# Altium schematic symbol library IC_Maxim.SchLib: 843 symbols (part 17 of 20) (continued)
## MAX8685FETD+ (continued)
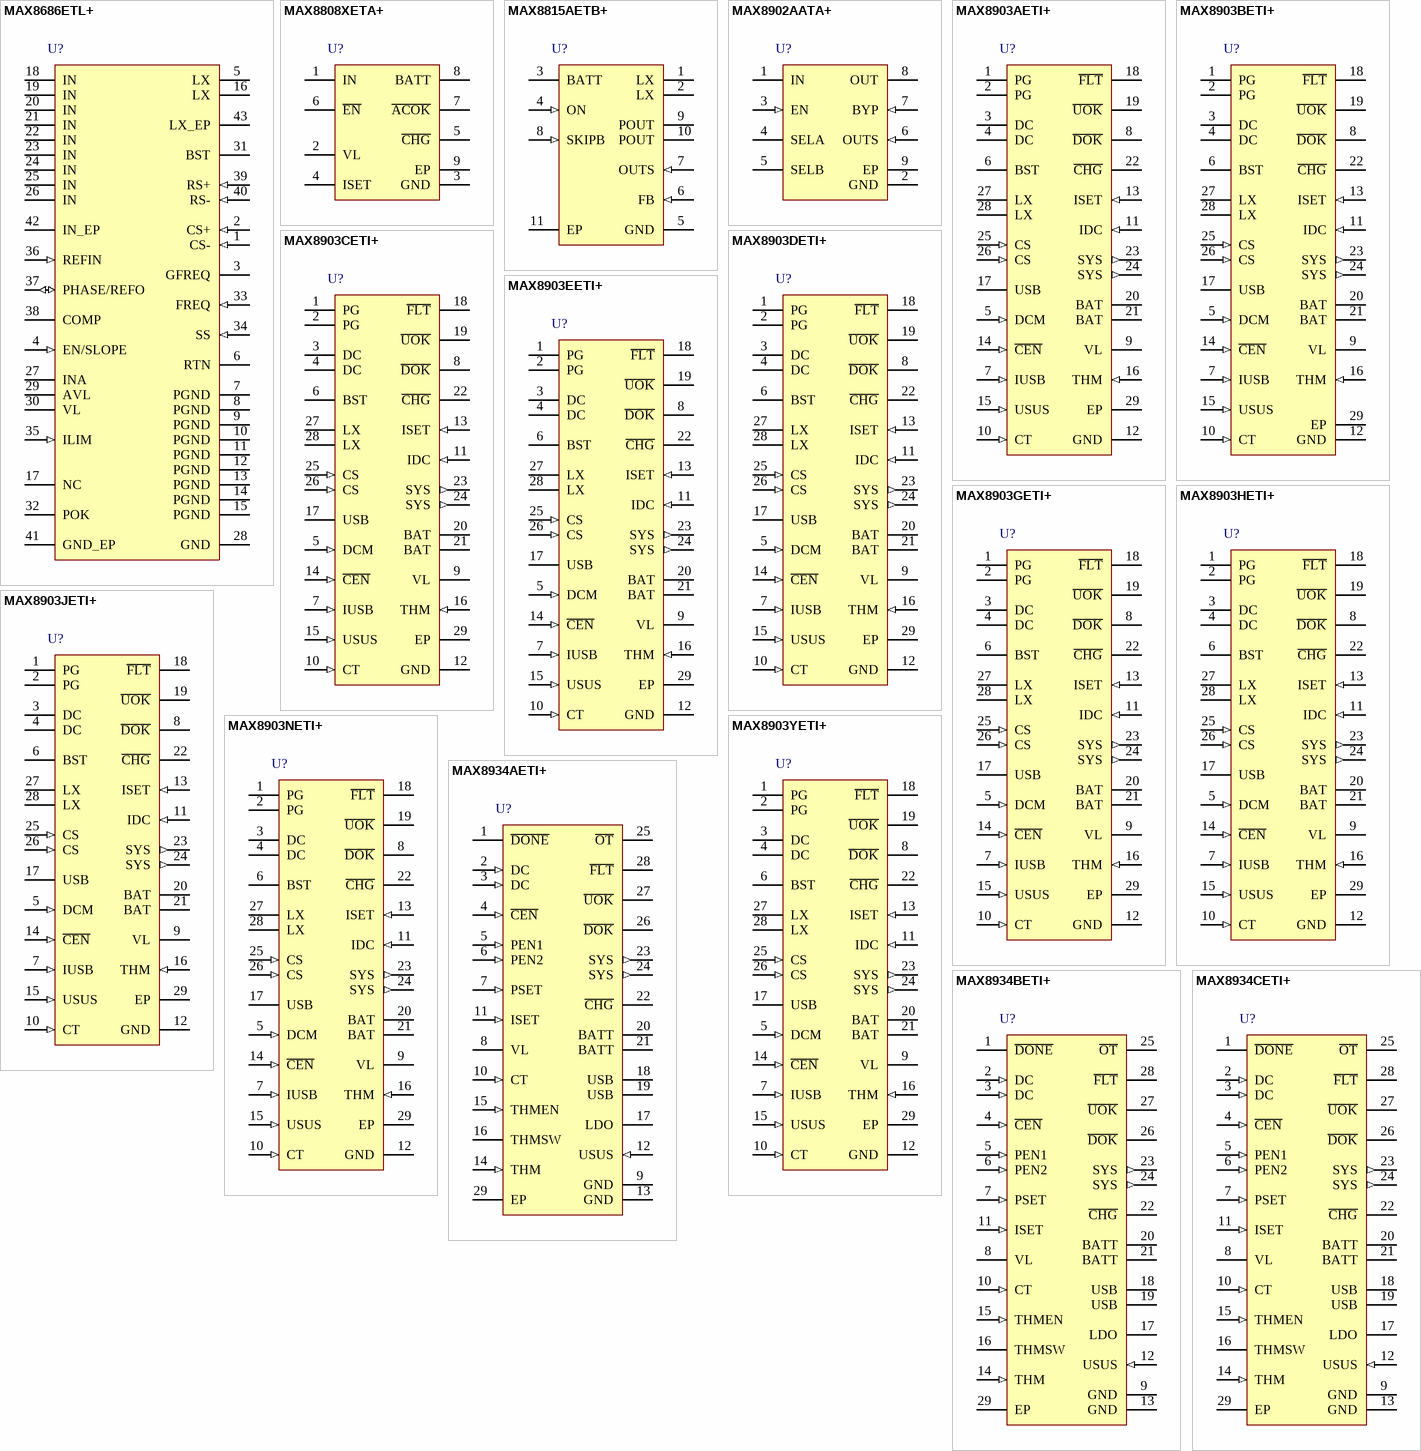
[diagram p19: symbols MAX8686ETL+ to MAX8934CETI+]

## MAX8686ETL+
designator U?
Single/Multiphase, Step-Down, DC-DC Converter with up to 25A Per Phase, 40-Pin TQFN, Pb-Free; DatasheetVersion: Rev 1, Oct-2010; PackageVersion: revE, 2011; PackageReference: T4066M+1; PackageDescription: 40-Pin Thin Quad Flat No-Lead, 6 x 6 x 0.75 mm Body, 0.5 mm Pitch, TQFN, Three Exposed Pads, Pb-Free; ComponentLink1Description: Manufacturer URL; ComponentLink1URL: http://www.maxim-ic.com; ComponentLink2Description: Datasheet; ComponentLink2URL: http://datasheets.maxim-ic.com/en/ds/MAX8686.pdf; ComponentLink3Description: Package Specification; ComponentLink3URL: http://pdfserv.maxim-ic.com/package_dwgs/21-0177.PDF
footprint QFN40_0.5-PAD(6X6)-A (Footprint not found)
pins: 1 CS- (in), 2 CS+ (in), 3 GFREQ, 4 EN/SLOPE (in), 5 LX, 6 RTN (power), 7 PGND (power), 8 PGND (power), 9 PGND (power), 10 PGND (power), 11 PGND (power), 12 PGND (power), 13 PGND (power), 14 PGND (power), 15 PGND (power), 16 LX, 17 NC, 18 IN (power), 19 IN (power), 20 IN (power), 21 IN (power), 22 IN (power), 23 IN (power), 24 IN (power), 25 IN (power), 26 IN (power), 27 INA (power), 28 GND (power), 29 AVL (power), 30 VL (power), 31 BST, 32 POK (oc), 33 FREQ (in), 34 SS (in), 35 ILIM (in), 36 REFIN (in), 37 PHASE/REFO (io), 38 COMP, 39 RS+ (in), 40 RS- (in), 41 GND_EP (power), 42 IN_EP, 43 LX_EP

## MAX8808XETA+
designator U?
1A Linear Li+ Battery Charger with Integrated Pass FET and Thermal Regulation, 8-Pin TDFN, -40癈 to +85癈, Pb-Free; DatasheetVersion: Rev 0, Apr-2005; PackageVersion: revF, 2011; PackageReference: T822+1; PackageDescription: 8-Pin Plastic Very Very Thin Dual Flatpack, No Leads, 2 x 2 x 0.75 mm Body, 0.5 mm Pitch, TDFN, Pb-Free; Code_JEDEC: MO-229*; ComponentLink1Description: Manufacturer URL; ComponentLink1URL: http://www.maxim-ic.com; ComponentLink2Description: Datasheet; ComponentLink2URL: http://datasheets.maxim-ic.com/en/ds/MAX8808X-MAX8808Z.pdf; ComponentLink3Description: Package Specification; ComponentLink3URL: http://pdfserv.maxim-ic.com/package_dwgs/21-0168.PDF
footprint DFN8_0.5-PAD(2X2) (Footprint not found)
pins: 1 IN (power), 2 VL (power), 3 GND (power), 4 ISET, 5 ~{CHG} (oc), 6 ~{EN}, 7 ~{ACOK} (oc), 8 BATT (power), 9 EP (power)

## MAX8815AETB+
designator U?
1A, 97% Efficiency, 30uA Quiescent Current, Step-Up Converter with True Shutdown(TM), 10-Pin TDFN-EP, -40癈 to +85癈, Pb-Free; DatasheetVersion: Rev 1, Aug-2008; PackageVersion: revJ, 2009; PackageReference: T1033+2; PackageDescription: 10-Pin Plastic Very Very Thin Dual Flatpack No Leads, Exposed Pad, 3 x 3 x 0.8 mm Body, TDFN-EP, Pb-Free; Code_JEDEC: MO-229-WEED-3; ComponentLink1Description: Manufacturer URL; ComponentLink1URL: http://www.maxim-ic.com; ComponentLink2Description: Datasheet; ComponentLink2URL: http://datasheets.maxim-ic.com/en/ds/MAX8815A.pdf; ComponentLink3Description: Package Specification; ComponentLink3URL: http://pdfserv.maxim-ic.com/package_dwgs/21-0137.PDF
footprint DFN10_0.5-PAD(3X3) (Footprint not found)
pins: 1 LX, 2 LX, 3 BATT (power), 4 ON (in), 5 GND (power), 6 FB (in), 7 OUTS (in), 8 SKIPB (in), 9 POUT (power), 10 POUT (power), 11 EP (power)

## MAX8902AATA+
designator U?
Low-Noise, Low-Dropout, High-PSRR, 500mA Linear Regulator, 8-Pin TDFN-EP, -40癈 to +125癈, Pb-Free; DatasheetVersion: Rev 4, Apr-2011; PackageVersion: revF, 2011; PackageReference: T822+1; PackageDescription: 8-Pin Plastic Very Very Thin Dual Flatpack, No Leads, 2 x 2 x 0.75 mm Body, 0.5 mm Pitch, TDFN, Pb-Free; Code_JEDEC: MO-229*; ComponentLink1Description: Manufacturer URL; ComponentLink1URL: http://www.maxim-ic.com; ComponentLink2Description: Datasheet; ComponentLink2URL: http://datasheets.maxim-ic.com/en/ds/MAX8902-MAX8902B.pdf; ComponentLink3Description: Package Specification; ComponentLink3URL: http://pdfserv.maxim-ic.com/package_dwgs/21-0168.PDF
footprint DFN8_0.5-PAD(2X2) (Footprint not found)
pins: 1 IN (power), 2 GND (power), 3 EN (in), 4 SELA, 5 SELB, 6 OUTS (in), 7 BYP (in), 8 OUT (power), 9 EP (power)

## MAX8903AETI+
designator U?
2A 1-Cell Li+ DC-DC Charger for USB and Adapter Power, 28-Pin TQFN, -40癈 to +85癈, Pb-Free; DatasheetVersion: Rev 5, Sep-2011; PackageVersion: revK, 2011; PackageReference: T2844+1; PackageDescription: 28-Pin Thin Quad Flatpack, No Leads, 4 x 4 x 0.75mm Body, 0.4 mm Pitch, TQFN, Pb-Free; ComponentLink1Description: Manufacturer URL; ComponentLink1URL: http://www.maxim-ic.com; ComponentLink2Description: Datasheet; ComponentLink2URL: http://datasheets.maxim-ic.com/en/ds/MAX8903A-MAX8903Y.pdf; ComponentLink3Description: Package Specification; ComponentLink3URL: http://pdfserv.maxim-ic.com/package_dwgs/21-0139.PDF
footprint QFN28_0.4-PAD(4X4) (Footprint not found)
pins: 1 PG (power), 2 PG (power), 3 DC (power), 4 DC (power), 5 DCM (in), 6 BST, 7 IUSB (in), 8 ~{DOK} (oc), 9 VL (power), 10 CT (in), 11 IDC (in), 12 GND (power), 13 ISET (in), 14 ~{CEN} (in), 15 USUS (in), 16 THM (in), 17 USB (power), 18 ~{FLT} (oc), 19 ~{UOK} (oc), 20 BAT (power), 21 BAT (power), 22 ~{CHG} (oc), 23 SYS (out), 24 SYS (out), 25 CS (in), 26 CS (in), 27 LX, 28 LX, 29 EP (power)

## MAX8903BETI+
designator U?
2A 1-Cell Li+ DC-DC Charger for USB and Adapter Power, 28-Pin TQFN, -40癈 to +85癈, Pb-Free; DatasheetVersion: Rev 5, Sep-2011; PackageVersion: revK, 2011; PackageReference: T2844+1; PackageDescription: 28-Pin Thin Quad Flatpack, No Leads, 4 x 4 x 0.75mm Body, 0.4 mm Pitch, TQFN, Pb-Free; ComponentLink1Description: Manufacturer URL; ComponentLink1URL: http://www.maxim-ic.com; ComponentLink2Description: Datasheet; ComponentLink2URL: http://datasheets.maxim-ic.com/en/ds/MAX8903A-MAX8903Y.pdf; ComponentLink3Description: Package Specification; ComponentLink3URL: http://pdfserv.maxim-ic.com/package_dwgs/21-0139.PDF
footprint QFN28_0.4-PAD(4X4) (Footprint not found)
pins: 1 PG (power), 2 PG (power), 3 DC (power), 4 DC (power), 5 DCM (in), 6 BST, 7 IUSB (in), 8 ~{DOK} (oc), 9 VL (power), 10 CT (in), 11 IDC (in), 12 GND (power), 13 ISET (in), 14 ~{CEN} (in), 15 USUS (in), 16 THM (in), 17 USB (power), 18 ~{FLT} (oc), 19 ~{UOK} (oc), 20 BAT (power), 21 BAT (power), 22 ~{CHG} (oc), 23 SYS (out), 24 SYS (out), 25 CS (in), 26 CS (in), 27 LX, 28 LX, 29 EP (power)

## MAX8903CETI+
designator U?
2A 1-Cell Li+ DC-DC Charger for USB and Adapter Power, 28-Pin TQFN, -40癈 to +85癈, Pb-Free; DatasheetVersion: Rev 5, Sep-2011; PackageVersion: revK, 2011; PackageReference: T2844+1; PackageDescription: 28-Pin Thin Quad Flatpack, No Leads, 4 x 4 x 0.75mm Body, 0.4 mm Pitch, TQFN, Pb-Free; ComponentLink1Description: Manufacturer URL; ComponentLink1URL: http://www.maxim-ic.com; ComponentLink2Description: Datasheet; ComponentLink2URL: http://datasheets.maxim-ic.com/en/ds/MAX8903A-MAX8903Y.pdf; ComponentLink3Description: Package Specification; ComponentLink3URL: http://pdfserv.maxim-ic.com/package_dwgs/21-0139.PDF
footprint QFN28_0.4-PAD(4X4) (Footprint not found)
pins: 1 PG (power), 2 PG (power), 3 DC (power), 4 DC (power), 5 DCM (in), 6 BST, 7 IUSB (in), 8 ~{DOK} (oc), 9 VL (power), 10 CT (in), 11 IDC (in), 12 GND (power), 13 ISET (in), 14 ~{CEN} (in), 15 USUS (in), 16 THM (in), 17 USB (power), 18 ~{FLT} (oc), 19 ~{UOK} (oc), 20 BAT (power), 21 BAT (power), 22 ~{CHG} (oc), 23 SYS (out), 24 SYS (out), 25 CS (in), 26 CS (in), 27 LX, 28 LX, 29 EP (power)

## MAX8903DETI+
designator U?
2A 1-Cell Li+ DC-DC Charger for USB and Adapter Power, 28-Pin TQFN, -40癈 to +85癈, Pb-Free; DatasheetVersion: Rev 5, Sep-2011; PackageVersion: revK, 2011; PackageReference: T2844+1; PackageDescription: 28-Pin Thin Quad Flatpack, No Leads, 4 x 4 x 0.75mm Body, 0.4 mm Pitch, TQFN, Pb-Free; ComponentLink1Description: Manufacturer URL; ComponentLink1URL: http://www.maxim-ic.com; ComponentLink2Description: Datasheet; ComponentLink2URL: http://datasheets.maxim-ic.com/en/ds/MAX8903A-MAX8903Y.pdf; ComponentLink3Description: Package Specification; ComponentLink3URL: http://pdfserv.maxim-ic.com/package_dwgs/21-0139.PDF
footprint QFN28_0.4-PAD(4X4) (Footprint not found)
pins: 1 PG (power), 2 PG (power), 3 DC (power), 4 DC (power), 5 DCM (in), 6 BST, 7 IUSB (in), 8 ~{DOK} (oc), 9 VL (power), 10 CT (in), 11 IDC (in), 12 GND (power), 13 ISET (in), 14 ~{CEN} (in), 15 USUS (in), 16 THM (in), 17 USB (power), 18 ~{FLT} (oc), 19 ~{UOK} (oc), 20 BAT (power), 21 BAT (power), 22 ~{CHG} (oc), 23 SYS (out), 24 SYS (out), 25 CS (in), 26 CS (in), 27 LX, 28 LX, 29 EP (power)

## MAX8903EETI+
designator U?
2A 1-Cell Li+ DC-DC Charger for USB and Adapter Power, 28-Pin TQFN, -40癈 to +85癈, Pb-Free; DatasheetVersion: Rev 5, Sep-2011; PackageVersion: revK, 2011; PackageReference: T2844+1; PackageDescription: 28-Pin Thin Quad Flatpack, No Leads, 4 x 4 x 0.75mm Body, 0.4 mm Pitch, TQFN, Pb-Free; ComponentLink1Description: Manufacturer URL; ComponentLink1URL: http://www.maxim-ic.com; ComponentLink2Description: Datasheet; ComponentLink2URL: http://datasheets.maxim-ic.com/en/ds/MAX8903A-MAX8903Y.pdf; ComponentLink3Description: Package Specification; ComponentLink3URL: http://pdfserv.maxim-ic.com/package_dwgs/21-0139.PDF
footprint QFN28_0.4-PAD(4X4) (Footprint not found)
pins: 1 PG (power), 2 PG (power), 3 DC (power), 4 DC (power), 5 DCM (in), 6 BST, 7 IUSB (in), 8 ~{DOK} (oc), 9 VL (power), 10 CT (in), 11 IDC (in), 12 GND (power), 13 ISET (in), 14 ~{CEN} (in), 15 USUS (in), 16 THM (in), 17 USB (power), 18 ~{FLT} (oc), 19 ~{UOK} (oc), 20 BAT (power), 21 BAT (power), 22 ~{CHG} (oc), 23 SYS (out), 24 SYS (out), 25 CS (in), 26 CS (in), 27 LX, 28 LX, 29 EP (power)

## MAX8903GETI+
designator U?
2A 1-Cell Li+ DC-DC Charger for USB and Adapter Power, 28-Pin TQFN, -40癈 to +85癈, Pb-Free; DatasheetVersion: Rev 5, Sep-2011; PackageVersion: revK, 2011; PackageReference: T2844+1; PackageDescription: 28-Pin Thin Quad Flatpack, No Leads, 4 x 4 x 0.75mm Body, 0.4 mm Pitch, TQFN, Pb-Free; ComponentLink1Description: Manufacturer URL; ComponentLink1URL: http://www.maxim-ic.com; ComponentLink2Description: Datasheet; ComponentLink2URL: http://datasheets.maxim-ic.com/en/ds/MAX8903A-MAX8903Y.pdf; ComponentLink3Description: Package Specification; ComponentLink3URL: http://pdfserv.maxim-ic.com/package_dwgs/21-0139.PDF
footprint QFN28_0.4-PAD(4X4) (Footprint not found)
pins: 1 PG (power), 2 PG (power), 3 DC (power), 4 DC (power), 5 DCM (in), 6 BST, 7 IUSB (in), 8 ~{DOK} (oc), 9 VL (power), 10 CT (in), 11 IDC (in), 12 GND (power), 13 ISET (in), 14 ~{CEN} (in), 15 USUS (in), 16 THM (in), 17 USB (power), 18 ~{FLT} (oc), 19 ~{UOK} (oc), 20 BAT (power), 21 BAT (power), 22 ~{CHG} (oc), 23 SYS (out), 24 SYS (out), 25 CS (in), 26 CS (in), 27 LX, 28 LX, 29 EP (power)

## MAX8903HETI+
designator U?
2A 1-Cell Li+ DC-DC Charger for USB and Adapter Power, 28-Pin TQFN, -40癈 to +85癈, Pb-Free; DatasheetVersion: Rev 5, Sep-2011; PackageVersion: revK, 2011; PackageReference: T2844+1; PackageDescription: 28-Pin Thin Quad Flatpack, No Leads, 4 x 4 x 0.75mm Body, 0.4 mm Pitch, TQFN, Pb-Free; ComponentLink1Description: Manufacturer URL; ComponentLink1URL: http://www.maxim-ic.com; ComponentLink2Description: Datasheet; ComponentLink2URL: http://datasheets.maxim-ic.com/en/ds/MAX8903A-MAX8903Y.pdf; ComponentLink3Description: Package Specification; ComponentLink3URL: http://pdfserv.maxim-ic.com/package_dwgs/21-0139.PDF
footprint QFN28_0.4-PAD(4X4) (Footprint not found)
pins: 1 PG (power), 2 PG (power), 3 DC (power), 4 DC (power), 5 DCM (in), 6 BST, 7 IUSB (in), 8 ~{DOK} (oc), 9 VL (power), 10 CT (in), 11 IDC (in), 12 GND (power), 13 ISET (in), 14 ~{CEN} (in), 15 USUS (in), 16 THM (in), 17 USB (power), 18 ~{FLT} (oc), 19 ~{UOK} (oc), 20 BAT (power), 21 BAT (power), 22 ~{CHG} (oc), 23 SYS (out), 24 SYS (out), 25 CS (in), 26 CS (in), 27 LX, 28 LX, 29 EP (power)

## MAX8903JETI+
designator U?
2A 1-Cell Li+ DC-DC Charger for USB and Adapter Power, 28-Pin TQFN, -40癈 to +85癈, Pb-Free; DatasheetVersion: Rev 5, Sep-2011; PackageVersion: revK, 2011; PackageReference: T2844+1; PackageDescription: 28-Pin Thin Quad Flatpack, No Leads, 4 x 4 x 0.75mm Body, 0.4 mm Pitch, TQFN, Pb-Free; ComponentLink1Description: Manufacturer URL; ComponentLink1URL: http://www.maxim-ic.com; ComponentLink2Description: Datasheet; ComponentLink2URL: http://datasheets.maxim-ic.com/en/ds/MAX8903A-MAX8903Y.pdf; ComponentLink3Description: Package Specification; ComponentLink3URL: http://pdfserv.maxim-ic.com/package_dwgs/21-0139.PDF
footprint QFN28_0.4-PAD(4X4) (Footprint not found)
pins: 1 PG (power), 2 PG (power), 3 DC (power), 4 DC (power), 5 DCM (in), 6 BST, 7 IUSB (in), 8 ~{DOK} (oc), 9 VL (power), 10 CT (in), 11 IDC (in), 12 GND (power), 13 ISET (in), 14 ~{CEN} (in), 15 USUS (in), 16 THM (in), 17 USB (power), 18 ~{FLT} (oc), 19 ~{UOK} (oc), 20 BAT (power), 21 BAT (power), 22 ~{CHG} (oc), 23 SYS (out), 24 SYS (out), 25 CS (in), 26 CS (in), 27 LX, 28 LX, 29 EP (power)

## MAX8903NETI+
designator U?
2A 1-Cell Li+ DC-DC Charger for USB and Adapter Power, 28-Pin TQFN, -40癈 to +85癈, Pb-Free; DatasheetVersion: Rev 5, Sep-2011; PackageVersion: revK, 2011; PackageReference: T2844+1; PackageDescription: 28-Pin Thin Quad Flatpack, No Leads, 4 x 4 x 0.75mm Body, 0.4 mm Pitch, TQFN, Pb-Free; ComponentLink1Description: Manufacturer URL; ComponentLink1URL: http://www.maxim-ic.com; ComponentLink2Description: Datasheet; ComponentLink2URL: http://datasheets.maxim-ic.com/en/ds/MAX8903A-MAX8903Y.pdf; ComponentLink3Description: Package Specification; ComponentLink3URL: http://pdfserv.maxim-ic.com/package_dwgs/21-0139.PDF
footprint QFN28_0.4-PAD(4X4) (Footprint not found)
pins: 1 PG (power), 2 PG (power), 3 DC (power), 4 DC (power), 5 DCM (in), 6 BST, 7 IUSB (in), 8 ~{DOK} (oc), 9 VL (power), 10 CT (in), 11 IDC (in), 12 GND (power), 13 ISET (in), 14 ~{CEN} (in), 15 USUS (in), 16 THM (in), 17 USB (power), 18 ~{FLT} (oc), 19 ~{UOK} (oc), 20 BAT (power), 21 BAT (power), 22 ~{CHG} (oc), 23 SYS (out), 24 SYS (out), 25 CS (in), 26 CS (in), 27 LX, 28 LX, 29 EP (power)

## MAX8903YETI+
designator U?
2A 1-Cell Li+ DC-DC Charger for USB and Adapter Power, 28-Pin TQFN, -40癈 to +85癈, Pb-Free; DatasheetVersion: Rev 5, Sep-2011; PackageVersion: revK, 2011; PackageReference: T2844+1; PackageDescription: 28-Pin Thin Quad Flatpack, No Leads, 4 x 4 x 0.75mm Body, 0.4 mm Pitch, TQFN, Pb-Free; ComponentLink1Description: Manufacturer URL; ComponentLink1URL: http://www.maxim-ic.com; ComponentLink2Description: Datasheet; ComponentLink2URL: http://datasheets.maxim-ic.com/en/ds/MAX8903A-MAX8903Y.pdf; ComponentLink3Description: Package Specification; ComponentLink3URL: http://pdfserv.maxim-ic.com/package_dwgs/21-0139.PDF
footprint QFN28_0.4-PAD(4X4) (Footprint not found)
pins: 1 PG (power), 2 PG (power), 3 DC (power), 4 DC (power), 5 DCM (in), 6 BST, 7 IUSB (in), 8 ~{DOK} (oc), 9 VL (power), 10 CT (in), 11 IDC (in), 12 GND (power), 13 ISET (in), 14 ~{CEN} (in), 15 USUS (in), 16 THM (in), 17 USB (power), 18 ~{FLT} (oc), 19 ~{UOK} (oc), 20 BAT (power), 21 BAT (power), 22 ~{CHG} (oc), 23 SYS (out), 24 SYS (out), 25 CS (in), 26 CS (in), 27 LX, 28 LX, 29 EP (power)

## MAX8934AETI+
designator U?
Dual-Input Linear Charger, Smart Power Selector with Advanced Battery Temperature Monitoring, 5.4V sys voltage, 3964 Thermistor beta+, 28-Pin TQFN, -40癈 to +85癈, Pb-Free; DatasheetVersion: Rev 2, Jun-2010; PackageVersion: revK, 2011; PackageReference: T2844+1; PackageDescription: 28-Pin Thin Quad Flatpack, No Leads, 4 x 4 x 0.75mm Body, 0.4 mm Pitch, TQFN, Pb-Free; ComponentLink1Description: Manufacturer URL; ComponentLink1URL: http://www.maxim-ic.com; ComponentLink2Description: Datasheet; ComponentLink2URL: http://datasheets.maxim-ic.com/en/ds/MAX8934A-MAX8934E.pdf; ComponentLink3Description: Package Specification; ComponentLink3URL: http://pdfserv.maxim-ic.com/package_dwgs/21-0139.PDF
footprint QFN28_0.4-PAD(4X4) (Footprint not found)
pins: 1 ~{DONE} (oc), 2 DC (in), 3 DC (in), 4 ~{CEN} (in), 5 PEN1 (in), 6 PEN2 (in), 7 PSET (in), 8 VL (power), 9 GND (power), 10 CT (in), 11 ISET (in), 12 USUS (in), 13 GND (power), 14 THM (in), 15 THMEN (in), 16 THMSW, 17 LDO (power), 18 USB (power), 19 USB (power), 20 BATT (power), 21 BATT (power), 22 ~{CHG} (oc), 23 SYS (out), 24 SYS (out), 25 ~{OT} (oc), 26 ~{DOK} (oc), 27 ~{UOK} (oc), 28 ~{FLT} (oc), 29 EP (power)

## MAX8934BETI+
designator U?
Dual-Input Linear Charger, Smart Power Selector with Advanced Battery Temperature Monitoring, 4.35V sys voltage, 3477 Thermistor beta+, 28-Pin TQFN, -40癈 to +85癈, Pb-Free; DatasheetVersion: Rev 2, Jun-2010; PackageVersion: revK, 2011; PackageReference: T2844+1; PackageDescription: 28-Pin Thin Quad Flatpack, No Leads, 4 x 4 x 0.75mm Body, 0.4 mm Pitch, TQFN, Pb-Free; ComponentLink1Description: Manufacturer URL; ComponentLink1URL: http://www.maxim-ic.com; ComponentLink2Description: Datasheet; ComponentLink2URL: http://datasheets.maxim-ic.com/en/ds/MAX8934A-MAX8934E.pdf; ComponentLink3Description: Package Specification; ComponentLink3URL: http://pdfserv.maxim-ic.com/package_dwgs/21-0139.PDF
footprint QFN28_0.4-PAD(4X4) (Footprint not found)
pins: 1 ~{DONE} (oc), 2 DC (in), 3 DC (in), 4 ~{CEN} (in), 5 PEN1 (in), 6 PEN2 (in), 7 PSET (in), 8 VL (power), 9 GND (power), 10 CT (in), 11 ISET (in), 12 USUS (in), 13 GND (power), 14 THM (in), 15 THMEN (in), 16 THMSW, 17 LDO (power), 18 USB (power), 19 USB (power), 20 BATT (power), 21 BATT (power), 22 ~{CHG} (oc), 23 SYS (out), 24 SYS (out), 25 ~{OT} (oc), 26 ~{DOK} (oc), 27 ~{UOK} (oc), 28 ~{FLT} (oc), 29 EP (power)

## MAX8934CETI+
designator U?
Dual-Input Linear Charger, Smart Power Selector with Advanced Battery Temperature Monitoring, 4.35V sys voltage, 3964 Thermistor beta+, 28-Pin TQFN, -40癈 to +85癈, Pb-Free; DatasheetVersion: Rev 2, Jun-2010; PackageVersion: revK, 2011; PackageReference: T2844+1; PackageDescription: 28-Pin Thin Quad Flatpack, No Leads, 4 x 4 x 0.75mm Body, 0.4 mm Pitch, TQFN, Pb-Free; ComponentLink1Description: Manufacturer URL; ComponentLink1URL: http://www.maxim-ic.com; ComponentLink2Description: Datasheet; ComponentLink2URL: http://datasheets.maxim-ic.com/en/ds/MAX8934A-MAX8934E.pdf; ComponentLink3Description: Package Specification; ComponentLink3URL: http://pdfserv.maxim-ic.com/package_dwgs/21-0139.PDF
footprint QFN28_0.4-PAD(4X4) (Footprint not found)
pins: 1 ~{DONE} (oc), 2 DC (in), 3 DC (in), 4 ~{CEN} (in), 5 PEN1 (in), 6 PEN2 (in), 7 PSET (in), 8 VL (power), 9 GND (power), 10 CT (in), 11 ISET (in), 12 USUS (in), 13 GND (power), 14 THM (in), 15 THMEN (in), 16 THMSW, 17 LDO (power), 18 USB (power), 19 USB (power), 20 BATT (power), 21 BATT (power), 22 ~{CHG} (oc), 23 SYS (out), 24 SYS (out), 25 ~{OT} (oc), 26 ~{DOK} (oc), 27 ~{UOK} (oc), 28 ~{FLT} (oc), 29 EP (power)

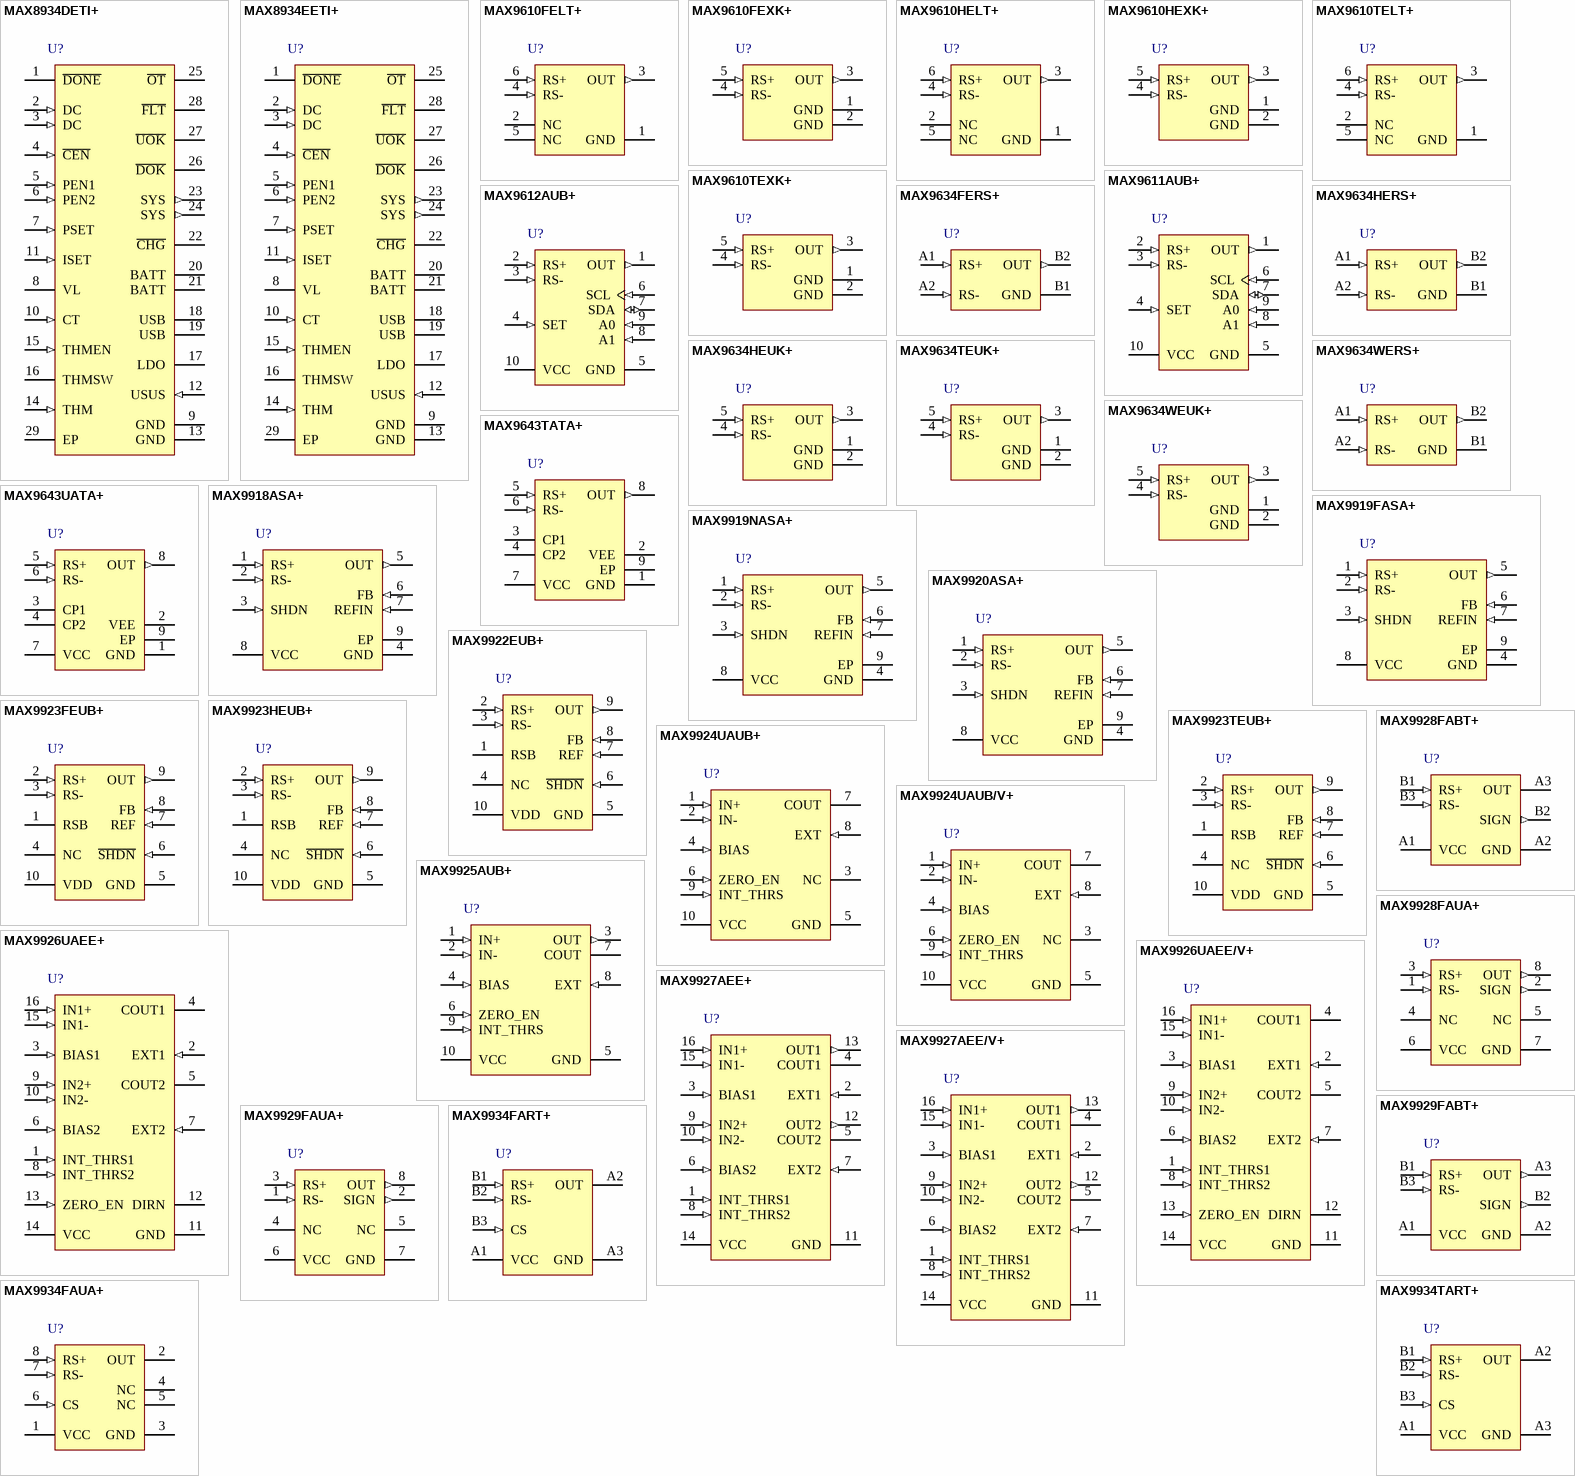
[diagram p20: symbols MAX8934DETI+ to MAX9934TART+]

## MAX8934DETI+
designator U?
Dual-Input Linear Charger, Smart Power Selector with Advanced Battery Temperature Monitoring, 4.35V sys voltage, 3477 Thermistor beta+, 28-Pin TQFN, -40癈 to +85癈, Pb-Free; DatasheetVersion: Rev 2, Jun-2010; PackageVersion: revK, 2011; PackageReference: T2844+1; PackageDescription: 28-Pin Thin Quad Flatpack, No Leads, 4 x 4 x 0.75mm Body, 0.4 mm Pitch, TQFN, Pb-Free; ComponentLink1Description: Manufacturer URL; ComponentLink1URL: http://www.maxim-ic.com; ComponentLink2Description: Datasheet; ComponentLink2URL: http://datasheets.maxim-ic.com/en/ds/MAX8934A-MAX8934E.pdf; ComponentLink3Description: Package Specification; ComponentLink3URL: http://pdfserv.maxim-ic.com/package_dwgs/21-0139.PDF
footprint QFN28_0.4-PAD(4X4) (Footprint not found)
pins: 1 ~{DONE} (oc), 2 DC (in), 3 DC (in), 4 ~{CEN} (in), 5 PEN1 (in), 6 PEN2 (in), 7 PSET (in), 8 VL (power), 9 GND (power), 10 CT (in), 11 ISET (in), 12 USUS (in), 13 GND (power), 14 THM (in), 15 THMEN (in), 16 THMSW, 17 LDO (power), 18 USB (power), 19 USB (power), 20 BATT (power), 21 BATT (power), 22 ~{CHG} (oc), 23 SYS (out), 24 SYS (out), 25 ~{OT} (oc), 26 ~{DOK} (oc), 27 ~{UOK} (oc), 28 ~{FLT} (oc), 29 EP (power)

## MAX8934EETI+
designator U?
Dual-Input Linear Charger, Smart Power Selector with Advanced Battery Temperature Monitoring, 4.35V sys voltage, 3477 Thermistor beta+, 28-Pin TQFN, -40癈 to +85癈, Pb-Free; DatasheetVersion: Rev 2, Jun-2010; PackageVersion: revK, 2011; PackageReference: T2844+1; PackageDescription: 28-Pin Thin Quad Flatpack, No Leads, 4 x 4 x 0.75mm Body, 0.4 mm Pitch, TQFN, Pb-Free; ComponentLink1Description: Manufacturer URL; ComponentLink1URL: http://www.maxim-ic.com; ComponentLink2Description: Datasheet; ComponentLink2URL: http://datasheets.maxim-ic.com/en/ds/MAX8934A-MAX8934E.pdf; ComponentLink3Description: Package Specification; ComponentLink3URL: http://pdfserv.maxim-ic.com/package_dwgs/21-0139.PDF
footprint QFN28_0.4-PAD(4X4) (Footprint not found)
pins: 1 ~{DONE} (oc), 2 DC (in), 3 DC (in), 4 ~{CEN} (in), 5 PEN1 (in), 6 PEN2 (in), 7 PSET (in), 8 VL (power), 9 GND (power), 10 CT (in), 11 ISET (in), 12 USUS (in), 13 GND (power), 14 THM (in), 15 THMEN (in), 16 THMSW, 17 LDO (power), 18 USB (power), 19 USB (power), 20 BATT (power), 21 BATT (power), 22 ~{CHG} (oc), 23 SYS (out), 24 SYS (out), 25 ~{OT} (oc), 26 ~{DOK} (oc), 27 ~{UOK} (oc), 28 ~{FLT} (oc), 29 EP (power)

## MAX9610FELT+
designator U?
1 uA, Lithium-Ion Battery, Precision Current-Sense Amplifier, 50 V / V Gain, -40 to 85 degC, 6-Pin SON (L611+1), Pb-Free; PartNumber: MAX9610FELT+; Bi-Dir. Curr. Sense: No; Gain: 25 V/V, 50 V/V ,100 V/V; DatasheetVersion: Rev. 0; PackageVersion: Rev. G, 01/2012; PackageReference: L611+1; PackageDescription: 6-Pin Micro Dual Flatpack No Lead, Body 1 x 1.5 mm, Pitch 0.5 mm; Supplier Part Number 1: N/A; Mounting Technology: Surface Mount; Code_JEDEC: MO-252; ComponentLink1Description: Manufacturer URL; ComponentLink1URL: http://www.maximintegrated.com/; ComponentLink2Description: Datasheet; ComponentLink2URL: http://datasheets.maximintegrated.com/en/ds/MAX9610.pdf; ComponentLink3Description: Package Specification; ComponentLink3URL: http://pdfserv.maximintegrated.com/package_dwgs/21-0147.PDF
footprint DFN6_0.5(1.5X1) (Footprint not found)
pins: 1 GND (power) "Ground", 2 NC "No Connection. Not internally connected.", 3 OUT (out) "Output", 4 RS- (in) "Load-Side Connection to External Sense Resistor", 5 NC "No Connection. Not internally connected.", 6 RS+ (in) "Power-Side Connection to External Sense Resistor"

## MAX9610FEXK+
designator U?
1 uA, Lithium-Ion Battery, Precision Current-Sense Amplifier, 50 V / V Gain, -40 to 85 degC, 5-Pin SOT23 (X5+1), Pb-Free; PartNumber: MAX9610FEXK+; Bi-Dir. Curr. Sense: No; Gain: 25 V/V, 50 V/V ,100 V/V; DatasheetVersion: Rev. 0; PackageVersion: Rev. F, 06/2011; PackageReference: X5+1; PackageDescription: 5-Pin SC70 Transistor Package (X5+1), Body 2 x 1.25 mm, Pitch 0.65 mm; Supplier Part Number 1: N/A; Mounting Technology: Surface Mount; Code_JEDEC: MO-203; ComponentLink1Description: Manufacturer URL; ComponentLink1URL: http://www.maximintegrated.com/; ComponentLink2Description: Datasheet; ComponentLink2URL: http://datasheets.maximintegrated.com/en/ds/MAX9610.pdf; ComponentLink3Description: Package Specification; ComponentLink3URL: http://pdfserv.maximintegrated.com/package_dwgs/21-0076.PDF
footprint SOT353 (Footprint not found)
pins: 1 GND (power) "Ground", 2 GND (power) "Ground", 3 OUT (out) "Output", 4 RS- (in) "Load- Side Connection to External Sense Resistor", 5 RS+ (in) "Power-Side Connection to External Sense Resistor"

## MAX9610HELT+
designator U?
1 uA, Lithium-Ion Battery, Precision Current-Sense Amplifier, 100 V / V Gain, -40 to 85 degC, 6-Pin SON (L611+1), Pb-Free; PartNumber: MAX9610HELT+; Bi-Dir. Curr. Sense: No; Gain: 25 V/V, 50 V/V ,100 V/V; DatasheetVersion: Rev. 0; PackageVersion: Rev. G, 01/2012; PackageReference: L611+1; PackageDescription: 6-Pin Micro Dual Flatpack No Lead, Body 1 x 1.5 mm, Pitch 0.5 mm; Supplier Part Number 1: N/A; Mounting Technology: Surface Mount; Code_JEDEC: MO-252; ComponentLink1Description: Manufacturer URL; ComponentLink1URL: http://www.maximintegrated.com/; ComponentLink2Description: Datasheet; ComponentLink2URL: http://datasheets.maximintegrated.com/en/ds/MAX9610.pdf; ComponentLink3Description: Package Specification; ComponentLink3URL: http://pdfserv.maximintegrated.com/package_dwgs/21-0147.PDF
footprint DFN6_0.5(1.5X1) (Footprint not found)
pins: 1 GND (power) "Ground", 2 NC "No Connection. Not internally connected.", 3 OUT (out) "Output", 4 RS- (in) "Load-Side Connection to External Sense Resistor", 5 NC "No Connection. Not internally connected.", 6 RS+ (in) "Power-Side Connection to External Sense Resistor"

## MAX9610HEXK+
designator U?
1 uA, Lithium-Ion Battery, Precision Current-Sense Amplifier, 100 V / V Gain, -40 to 85 degC, 5-Pin SOT23 (X5+1), Pb-Free; PartNumber: MAX9610HEXK+; Bi-Dir. Curr. Sense: No; Gain: 25 V/V, 50 V/V ,100 V/V; DatasheetVersion: Rev. 0; PackageVersion: Rev. F, 06/2011; PackageReference: X5+1; PackageDescription: 5-Pin SC70 Transistor Package (X5+1), Body 2 x 1.25 mm, Pitch 0.65 mm; Supplier Part Number 1: N/A; Mounting Technology: Surface Mount; Code_JEDEC: MO-203; ComponentLink1Description: Manufacturer URL; ComponentLink1URL: http://www.maximintegrated.com/; ComponentLink2Description: Datasheet; ComponentLink2URL: http://datasheets.maximintegrated.com/en/ds/MAX9610.pdf; ComponentLink3Description: Package Specification; ComponentLink3URL: http://pdfserv.maximintegrated.com/package_dwgs/21-0076.PDF
footprint SOT353 (Footprint not found)
pins: 1 GND (power) "Ground", 2 GND (power) "Ground", 3 OUT (out) "Output", 4 RS- (in) "Load- Side Connection to External Sense Resistor", 5 RS+ (in) "Power-Side Connection to External Sense Resistor"

## MAX9610TELT+
designator U?
1 uA, Lithium-Ion Battery, Precision Current-Sense Amplifier, 25 V / V Gain, -40 to 85 degC, 6-Pin SON (L611+1), Pb-Free; PartNumber: MAX9610TELT+; Bi-Dir. Curr. Sense: No; Gain: 25 V/V, 50 V/V ,100 V/V; DatasheetVersion: Rev. 0; PackageVersion: Rev. G, 01/2012; PackageReference: L611+1; PackageDescription: 6-Pin Micro Dual Flatpack No Lead, Body 1 x 1.5 mm, Pitch 0.5 mm; Supplier Part Number 1: N/A; Mounting Technology: Surface Mount; Code_JEDEC: MO-252; ComponentLink1Description: Manufacturer URL; ComponentLink1URL: http://www.maximintegrated.com/; ComponentLink2Description: Datasheet; ComponentLink2URL: http://datasheets.maximintegrated.com/en/ds/MAX9610.pdf; ComponentLink3Description: Package Specification; ComponentLink3URL: http://pdfserv.maximintegrated.com/package_dwgs/21-0147.PDF
footprint DFN6_0.5(1.5X1) (Footprint not found)
pins: 1 GND (power) "Ground", 2 NC "No Connection. Not internally connected.", 3 OUT (out) "Output", 4 RS- (in) "Load-Side Connection to External Sense Resistor", 5 NC "No Connection. Not internally connected.", 6 RS+ (in) "Power-Side Connection to External Sense Resistor"

## MAX9610TEXK+
designator U?
1 uA, Lithium-Ion Battery, Precision Current-Sense Amplifier, 25 V / V Gain, -40 to 85 degC, 5-Pin SOT23 (X5+1), Pb-Free; PartNumber: MAX9610TEXK+; Bi-Dir. Curr. Sense: No; Gain: 25 V/V, 50 V/V ,100 V/V; DatasheetVersion: Rev. 0; PackageVersion: Rev. F, 06/2011; PackageReference: X5+1; PackageDescription: 5-Pin SC70 Transistor Package (X5+1), Body 2 x 1.25 mm, Pitch 0.65 mm; Supplier Part Number 1: N/A; Mounting Technology: Surface Mount; Code_JEDEC: MO-203; ComponentLink1Description: Manufacturer URL; ComponentLink1URL: http://www.maximintegrated.com/; ComponentLink2Description: Datasheet; ComponentLink2URL: http://datasheets.maximintegrated.com/en/ds/MAX9610.pdf; ComponentLink3Description: Package Specification; ComponentLink3URL: http://pdfserv.maximintegrated.com/package_dwgs/21-0076.PDF
footprint SOT353 (Footprint not found)
pins: 1 GND (power) "Ground", 2 GND (power) "Ground", 3 OUT (out) "Output", 4 RS- (in) "Load- Side Connection to External Sense Resistor", 5 RS+ (in) "Power-Side Connection to External Sense Resistor"

## MAX9611AUB+
designator U?
High-side Current-Sense Amplifier with 12-bit I2C ADC and Op Amp / Comparator - Non-inverting, Adjustable Gain, -40 to 125 degC, 10-Pin SOP (U10+2), Pb-Free; PartNumber: MAX9611AUB+; Bi-Dir. Curr. Sense: No; Gain: Adj.; DatasheetVersion: Rev. 3; PackageVersion: Rev. L, 07/2008; PackageReference: U10+2; PackageDescription: 10-Pin Micro-MAX, Thin Shrink Small-Outline (U10+2), Body 3 x 3 mm, Pitch 0.5 mm; Supplier Part Number 1: MAX9611AUB+-ND; Supplier Part Number 2: 2212297; Supplier Part Number 3: 45W6334; Supplier Part Number 4: 700-MAX9611AUB+; Mounting Technology: Surface Mount; Code_JEDEC: MO-187; ComponentLink1Description: Manufacturer URL; ComponentLink1URL: http://www.maximintegrated.com/; ComponentLink2Description: Datasheet; ComponentLink2URL: http://datasheets.maximintegrated.com/en/ds/MAX9611-MAX9612.pdf; ComponentLink3Description: Package Specification; ComponentLink3URL: http://pdfserv.maximintegrated.com/package_dwgs/21-0061.PDF
footprint VSSOP10_0.5 (Footprint not found)
pins: 1 OUT (out) "Internal Amplifier/Comparator Output", 2 RS+ (in) "Positive Current-Sensing Input. Power side connects to external sense resistor.", 3 RS- (in) "Negative Current-Sensing Input. Load side connects to external sense resistor.", 4 SET (in) "External Set-Point Voltage", 5 GND (power) "Ground", 6 SCL (in) "I2C Interface Clock Input", 7 SDA (io) "I2C Interface Data Input/Output", 8 A1 (in) "Address Input 1", 9 A0 (in) "Address Input 0", 10 VCC (power) "Supply Voltage Input. Bypass VCC to GND with a 0.1uF and a 4.7uF capacitor in parallel."